# Altium footprint library MyPcb.PcbLib: 367 footprints (part 8 of 23)
Each footprint in its own frame and in the unit in brackets; x right, y up, seen from the top. Pads: shape width x height; smd on the part's side, far side on the other; paste and mask are expansions set on the pad; w line width, h text height; cw(c..) or ccw(c..) is an arc to the next point about the centre after c.
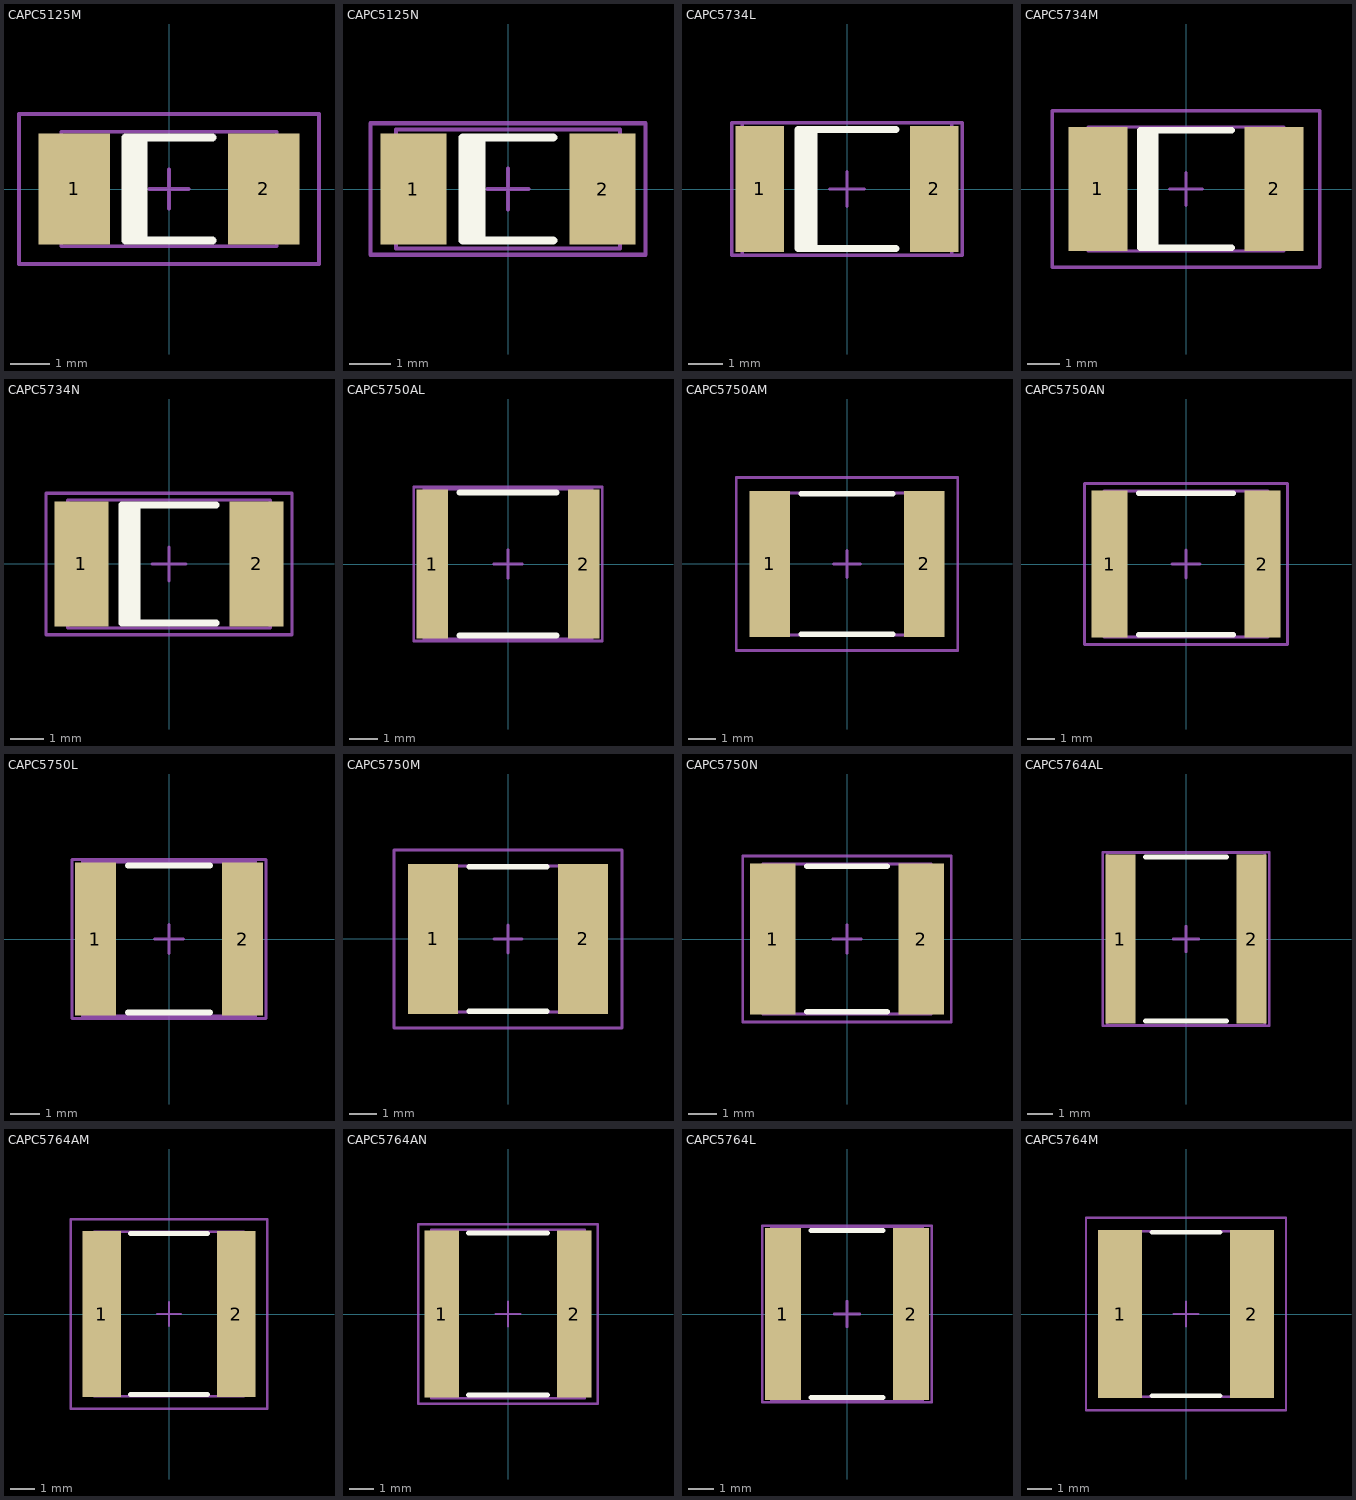
[diagram p7: the footprints below, top view; thin cyan lines are the x and y axes]

## CAPC5125M [mm] "Chip Capacitor, Body 5.08x2.54mm, IPC Low Density"
height 1.66
pads (2):
  rect 1.8x2.8 smd: 1(-2.4,0) 2(2.4,0)
Top Overlay:
  rectangle: -1.1,-1.3 -0.55,1.3
  lines w0.2: 1.1,-1.3 -1.1,-1.3 -1.1,1.3 1.1,1.3
Mechanical 13:
  lines w0.1: -2.73,-1.45 2.73,-1.45 2.73,1.45 -2.73,1.45 -2.73,-1.45
Mechanical 15:
  lines w0.1: -0.5,0 0.5,0 ; 0,-0.5 0,0.5 ; -3.8,-1.9 3.8,-1.9 3.8,1.9 -3.8,1.9 -3.8,-1.9
3D body: height 1.66, standoff 0, extent -2.73,-1.45 2.73,1.45

## CAPC5125N [mm] "Chip Capacitor, Body 5.08x2.54mm, IPC Medium Density"
height 1.66
pads (2):
  rect 1.6x2.7 smd: 1(-2.3,0) 2(2.3,0)
Top Overlay:
  rectangle: -1.1,-1.25 -0.55,1.25
  lines w0.2: 1.1,-1.25 -1.1,-1.25 -1.1,1.25 1.1,1.25
Mechanical 13:
  lines w0.1: -2.73,-1.45 2.73,-1.45 2.73,1.45 -2.73,1.45 -2.73,-1.45
Mechanical 15:
  lines w0.1: -0.5,0 0.5,0 ; 0,-0.5 0,0.5 ; -3.35,-1.6 3.35,-1.6 3.35,1.6 -3.35,1.6 -3.35,-1.6
3D body: height 1.66, standoff 0, extent -2.73,-1.45 2.73,1.45

## CAPC5734L [mm] "Chip Capacitor, Body 5.7x3.4mm, IPC High Density"
height 2.16
pads (2):
  rect 1.4x3.6 smd: 1(-2.5,0) 2(2.5,0)
Top Overlay:
  rectangle: -1.4,-1.7 -0.85,1.7
  lines w0.2: 1.4,-1.7 -1.4,-1.7 -1.4,1.7 1.4,1.7
Mechanical 13:
  lines w0.1: -3,-1.9 -3,1.9 3,1.9 3,-1.9 -3,-1.9
Mechanical 15:
  lines w0.1: -0.5,0 0.5,0 ; 0,-0.5 0,0.5 ; -3.3,-1.9 -3.3,1.9 3.3,1.9 3.3,-1.9 -3.3,-1.9
3D body: height 2.16, standoff 0, extent -3,-1.9 3,1.9

## CAPC5734M [mm] "Chip Capacitor, Body 5.7x3.4mm, IPC Low Density"
height 2.16
pads (2):
  rect 1.8x3.8 smd: 1(-2.7,0) 2(2.7,0)
Top Overlay:
  rectangle: -1.4,-1.8 -0.85,1.8
  lines w0.2: 1.4,-1.8 -1.4,-1.8 -1.4,1.8 1.4,1.8
Mechanical 13:
  lines w0.1: -3,-1.9 3,-1.9 3,1.9 -3,1.9 -3,-1.9
Mechanical 15:
  lines w0.1: -0.5,0 0.5,0 ; 0,-0.5 0,0.5 ; -4.1,-2.4 4.1,-2.4 4.1,2.4 -4.1,2.4 -4.1,-2.4
3D body: height 2.16, standoff 0, extent -3,-1.9 3,1.9

## CAPC5734N [mm] "Chip Capacitor, Body 5.7x3.4mm, IPC Medium Density"
height 2.16
pads (2):
  rect 1.6x3.7 smd: 1(-2.6,0) 2(2.6,0)
Top Overlay:
  rectangle: -1.4,-1.75 -0.85,1.75
  lines w0.2: 1.4,-1.75 -1.4,-1.75 -1.4,1.75 1.4,1.75
Mechanical 13:
  lines w0.1: -3,-1.9 3,-1.9 3,1.9 -3,1.9 -3,-1.9
Mechanical 15:
  lines w0.1: -0.5,0 0.5,0 ; 0,-0.5 0,0.5 ; -3.65,-2.1 3.65,-2.1 3.65,2.1 -3.65,2.1 -3.65,-2.1
3D body: height 2.16, standoff 0, extent -3,-1.9 3,1.9

## CAPC5750AL [mm] "Chip Capacitor, Body 5.7x5.0mm, IPC High Density"
height 1.8
pads (2):
  rect 1.1x5.2 smd: 1(-2.65,0) 2(2.65,0)
Top Overlay:
  lines w0.2: -1.7,-2.5 1.7,-2.5 ; -1.7,2.5 1.7,2.5
Mechanical 13:
  lines w0.1: -2.95,-2.625 -2.95,2.625 2.95,2.625 2.95,-2.625 -2.95,-2.625
Mechanical 15:
  lines w0.1: -0.5,0 0.5,0 ; 0,-0.5 0,0.5 ; -3.3,-2.7 -3.3,2.7 3.3,2.7 3.3,-2.7 -3.3,-2.7
3D body: height 1.8, standoff 0, extent -2.95,-2.625 2.95,2.625

## CAPC5750AM [mm] "Chip Capacitor, Body 5.7x5.0mm, IPC Low Density"
height 1.8
pads (2):
  rect 1.5x5.4 smd: 1(-2.85,0) 2(2.85,0)
Top Overlay:
  lines w0.2: -1.7,-2.6 1.7,-2.6 ; -1.7,2.6 1.7,2.6
Mechanical 13:
  lines w0.1: -2.95,-2.625 2.95,-2.625 2.95,2.625 -2.95,2.625 -2.95,-2.625
Mechanical 15:
  lines w0.1: -0.5,0 0.5,0 ; 0,-0.5 0,0.5 ; -4.1,-3.2 4.1,-3.2 4.1,3.2 -4.1,3.2 -4.1,-3.2
3D body: height 1.8, standoff 0, extent -2.95,-2.625 2.95,2.625

## CAPC5750AN [mm] "Chip Capacitor, Body 5.7x5.0mm, IPC Medium Density"
height 1.8
pads (2):
  rect 1.3x5.3 smd: 1(-2.75,0) 2(2.75,0)
Top Overlay:
  lines w0.2: -1.7,-2.55 1.7,-2.55 ; -1.7,2.55 1.7,2.55
Mechanical 13:
  lines w0.1: -2.95,-2.625 2.95,-2.625 2.95,2.625 -2.95,2.625 -2.95,-2.625
Mechanical 15:
  lines w0.1: -0.5,0 0.5,0 ; 0,-0.5 0,0.5 ; -3.65,-2.9 3.65,-2.9 3.65,2.9 -3.65,2.9 -3.65,-2.9
3D body: height 1.8, standoff 0, extent -2.95,-2.625 2.95,2.625

## CAPC5750L [mm] "Chip Capacitor, Body 5.7x5.0mm, IPC High Density"
height 1.35
pads (2):
  rect 1.4x5.2 smd: 1(-2.5,0) 2(2.5,0)
Top Overlay:
  lines w0.2: -1.4,-2.5 1.4,-2.5 ; -1.4,2.5 1.4,2.5
Mechanical 13:
  lines w0.1: -2.95,-2.625 2.95,-2.625 2.95,2.625 -2.95,2.625 -2.95,-2.625
Mechanical 15:
  lines w0.1: -0.5,0 0.5,0 ; 0,-0.5 0,0.5 ; -3.3,-2.7 3.3,-2.7 3.3,2.7 -3.3,2.7 -3.3,-2.7
3D body: height 1.35, standoff 0, extent -2.95,-2.625 2.95,2.625

## CAPC5750M [mm] "Chip Capacitor, Body 5.7x5.0mm, IPC Low Density"
height 1.35
pads (2):
  rect 1.8x5.4 smd: 1(-2.7,0) 2(2.7,0)
Top Overlay:
  lines w0.2: -1.4,-2.6 1.4,-2.6 ; -1.4,2.6 1.4,2.6
Mechanical 13:
  lines w0.1: -2.95,-2.625 2.95,-2.625 2.95,2.625 -2.95,2.625 -2.95,-2.625
Mechanical 15:
  lines w0.1: -0.5,0 0.5,0 ; 0,-0.5 0,0.5 ; -4.1,-3.2 4.1,-3.2 4.1,3.2 -4.1,3.2 -4.1,-3.2
3D body: height 1.35, standoff 0, extent -2.95,-2.625 2.95,2.625

## CAPC5750N [mm] "Chip Capacitor, Body 5.7x5.0mm, IPC Medium Density"
height 1.35
pads (2):
  rect 1.6x5.3 smd: 1(-2.6,0) 2(2.6,0)
Top Overlay:
  lines w0.2: -1.4,-2.55 1.4,-2.55 ; -1.4,2.55 1.4,2.55
Mechanical 13:
  lines w0.1: -2.95,-2.625 2.95,-2.625 2.95,2.625 -2.95,2.625 -2.95,-2.625
Mechanical 15:
  lines w0.1: -0.5,0 0.5,0 ; 0,-0.5 0,0.5 ; -3.65,-2.9 3.65,-2.9 3.65,2.9 -3.65,2.9 -3.65,-2.9
3D body: height 1.35, standoff 0, extent -2.95,-2.625 2.95,2.625

## CAPC5764AL [mm] "Chip Capacitor, Body 5.7x6.4mm, IPC High Density"
height 2.03
pads (2):
  rect 1.2x6.7 smd: 1(-2.6,0) 2(2.6,0)
Top Overlay:
  lines w0.2: -1.6,-3.25 1.6,-3.25 ; -1.6,3.25 1.6,3.25
Mechanical 13:
  lines w0.1: -3.115,-3.43 -3.115,3.43 3.115,3.43 3.115,-3.43 -3.115,-3.43
Mechanical 15:
  lines w0.1: -0.5,0 0.5,0 ; 0,-0.5 0,0.5 ; -3.3,-3.45 -3.3,3.45 3.3,3.45 3.3,-3.45 -3.3,-3.45
3D body: height 2.03, standoff 0, extent -3.115,-3.43 3.115,3.43

## CAPC5764AM [mm] "Chip Capacitor, Body 5.7x6.4mm, IPC Low Density"
height 2.03
pads (2):
  rect 1.6x6.9 smd: 1(-2.8,0) 2(2.8,0)
Top Overlay:
  lines w0.2: -1.6,-3.35 1.6,-3.35 ; -1.6,3.35 1.6,3.35
Mechanical 13:
  lines w0.1: -3.115,-3.43 3.115,-3.43 3.115,3.43 -3.115,3.43 -3.115,-3.43
Mechanical 15:
  lines w0.1: -0.5,0 0.5,0 ; 0,-0.5 0,0.5 ; -4.1,-3.95 4.1,-3.95 4.1,3.95 -4.1,3.95 -4.1,-3.95
3D body: height 2.03, standoff 0, extent -3.115,-3.43 3.115,3.43

## CAPC5764AN [mm] "Chip Capacitor, Body 5.7x6.4mm, IPC Medium Density"
height 2.03
pads (2):
  rect 1.4x6.8 smd: 1(-2.7,0) 2(2.7,0)
Top Overlay:
  lines w0.2: -1.6,-3.3 1.6,-3.3 ; -1.6,3.3 1.6,3.3
Mechanical 13:
  lines w0.1: -3.115,-3.43 3.115,-3.43 3.115,3.43 -3.115,3.43 -3.115,-3.43
Mechanical 15:
  lines w0.1: -0.5,0 0.5,0 ; 0,-0.5 0,0.5 ; -3.65,-3.65 3.65,-3.65 3.65,3.65 -3.65,3.65 -3.65,-3.65
3D body: height 2.03, standoff 0, extent -3.115,-3.43 3.115,3.43

## CAPC5764L [mm] "Chip Capacitor, Body 5.7x6.4mm, IPC High Density"
height 2
pads (2):
  rect 1.4x6.7 smd: 1(-2.5,0) 2(2.5,0)
Top Overlay:
  lines w0.2: -1.4,-3.25 1.4,-3.25 ; -1.4,3.25 1.4,3.25
Mechanical 13:
  lines w0.1: -2.95,-3.4 -2.95,3.4 2.95,3.4 2.95,-3.4 -2.95,-3.4
Mechanical 15:
  lines w0.1: -0.5,0 0.5,0 ; 0,-0.5 0,0.5 ; -3.3,-3.45 -3.3,3.45 3.3,3.45 3.3,-3.45 -3.3,-3.45
3D body: height 2, standoff 0, extent -2.95,-3.4 2.95,3.4

## CAPC5764M [mm] "Chip Capacitor, Body 5.7x6.4mm, IPC Low Density"
height 2
pads (2):
  rect 1.8x6.9 smd: 1(-2.7,0) 2(2.7,0)
Top Overlay:
  lines w0.2: -1.4,-3.35 1.4,-3.35 ; -1.4,3.35 1.4,3.35
Mechanical 13:
  lines w0.1: -2.95,-3.4 2.95,-3.4 2.95,3.4 -2.95,3.4 -2.95,-3.4
Mechanical 15:
  lines w0.1: -0.5,0 0.5,0 ; 0,-0.5 0,0.5 ; -4.1,-3.95 4.1,-3.95 4.1,3.95 -4.1,3.95 -4.1,-3.95
3D body: height 2, standoff 0, extent -2.95,-3.4 2.95,3.4